# Altium footprint library mastermind.PCBLIB: 1061 footprints (part 34 of 67)
Each footprint in its own frame and in the unit in brackets; x right, y up, seen from the top. Pads: shape width x height; smd on the part's side, far side on the other; paste and mask are expansions set on the pad; w line width, h text height; cw(c..) or ccw(c..) is an arc to the next point about the centre after c.
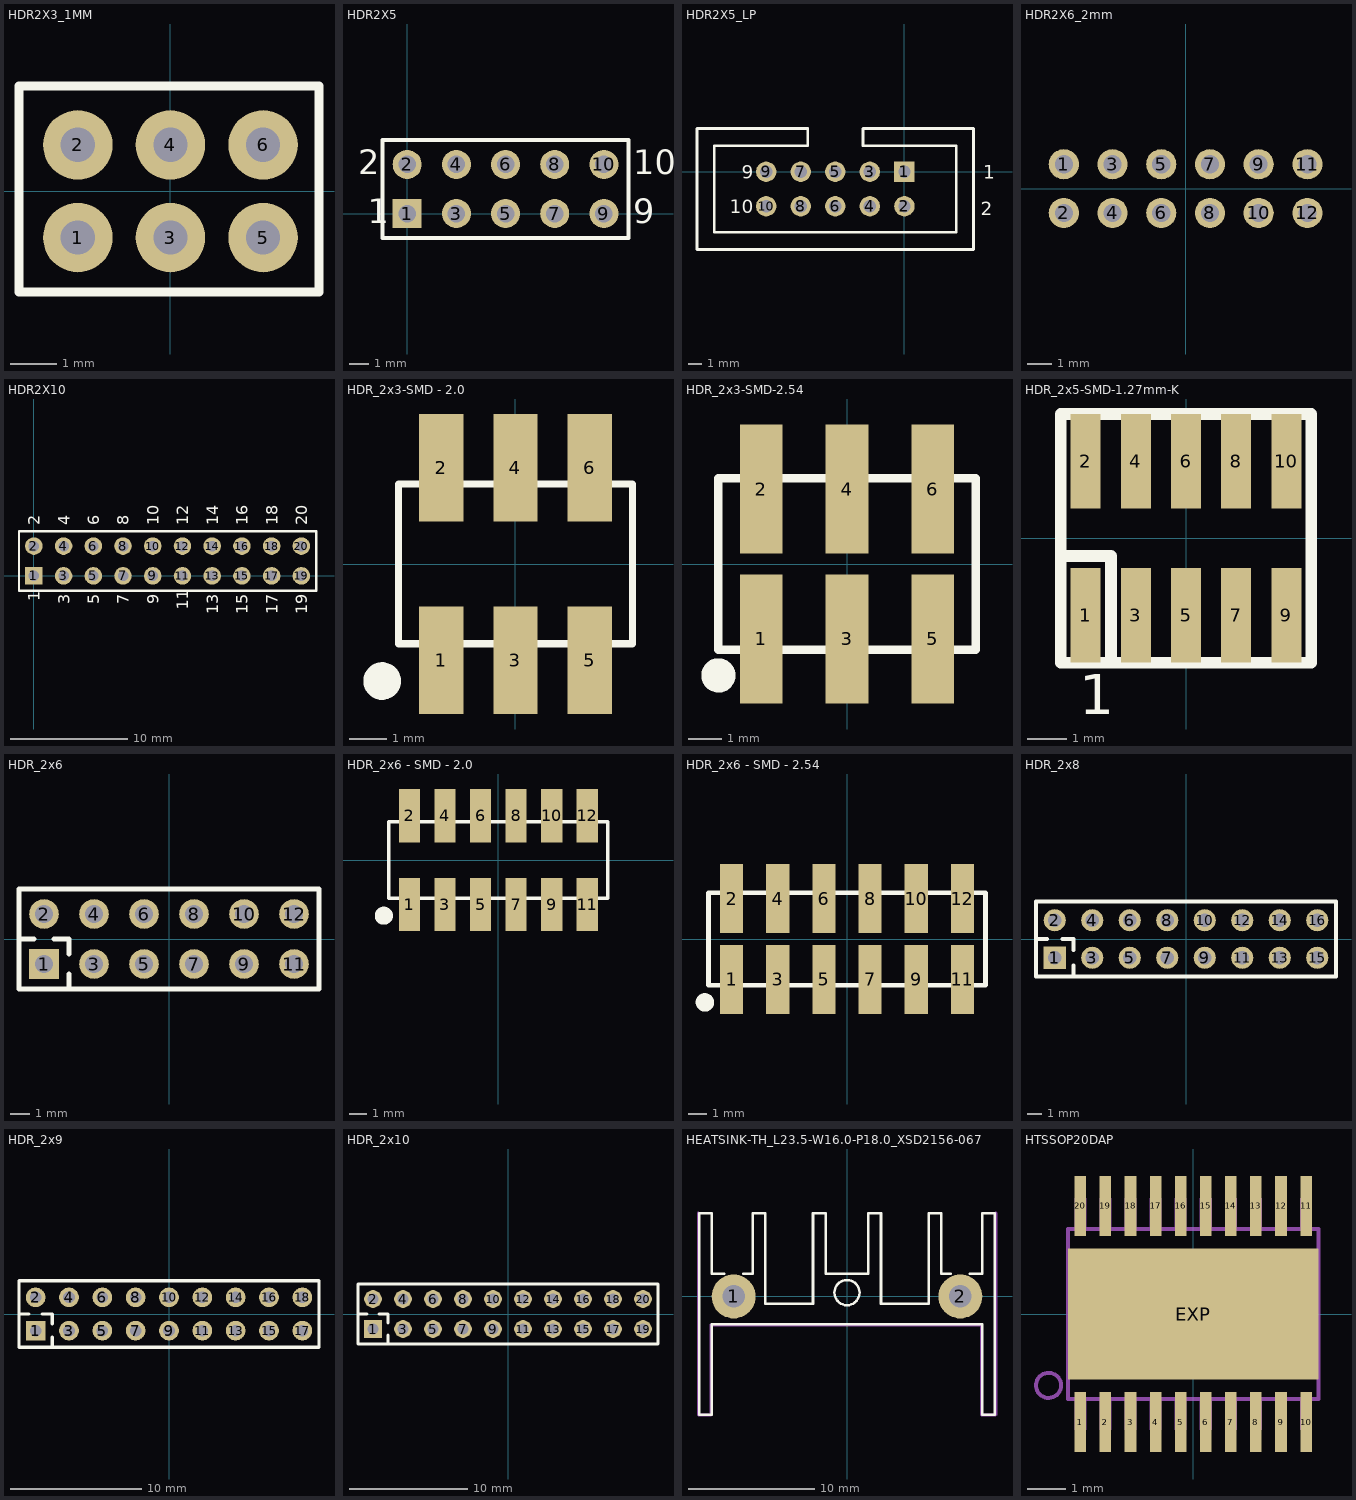
[diagram p33: the footprints below, top view; thin cyan lines are the x and y axes]

## HDR2X3_1MM [mm] "Connector; Header; 3x2 Position"
pads (6):
  round 1.5 / inner round 1.24 / far side round 1.24 hole 0.74: 1(-2,-1) 2(-2,1) 3(0,-1) 4(0,1) 5(2,-1) 6(2,1)
Top Overlay:
  lines w0.2: -3.27,-2.175 3.207,-2.175 3.207,2.27 -3.27,2.27 -3.27,-2.175
Bottom Overlay:

## HDR2X5 [mm] "Connector; Header; 5x2 Position"
height 1.4
pads (10):
  rect 1.5x1.5 hole 0.9: 1(0,0)
  round 1.5 hole 0.9: 2(0,2.54) 3(2.54,0) 4(2.54,2.54) 5(5.08,0) 6(5.08,2.54) 7(7.62,0) 8(7.62,2.54) 9(10.16,0) 10(10.16,2.54)
Top Overlay:
  lines w0.2: -1.27,-1.27 -1.27,3.81 11.43,3.81 11.43,-1.27 -1.27,-1.27
  text "2" at -2.54,2.032 h1.27
  text "1" at -2.032,-0.508 h1.27
  text "9" at 11.684,-0.508 h1.27
  text "10" at 11.684,2.032 h1.27
3D body "CON10_2X5_P100UM_HDR2_TYC.step": height 9.5, standoff -5.08, extent -1.27,-1.27 11.43,3.81

## HDR2X5_LP [mm]
pads (10):
  rect 1.5x1.5 hole 0.9: 1(0.003,0.004)
  round 1.5 hole 0.9: 2(0.003,-2.536) 3(-2.537,0.004) 4(-2.537,-2.536) 5(-5.077,0.004) 6(-5.077,-2.536) 7(-7.617,0.004) 8(-7.617,-2.536) 9(-10.157,0.004) 10(-10.157,-2.536)
Top Overlay:
  lines w0.2: -7.109,1.909 -7.109,3.179 -15.237,3.179 -15.237,-5.711 5.083,-5.711 5.083,3.179 -3.045,3.179 -3.045,1.909 ; -7.1,1.909 -13.967,1.909 -13.967,-4.441 3.813,-4.441 3.813,1.91 -3.05,1.91
  text "2" at 5.603,-3.196 h1
  text "1" at 5.803,-0.496 h1
  text "9" at -11.935,-0.504 h1
  text "10" at -12.824,-3.044 h1
3D body: height 10, standoff 0, extent -15.237,-5.711 5.082,3.178
3D body: height 2, standoff 0, extent -15.24,-5.715 5.08,3.175
3D body: height 10, standoff 0, extent -0.5,-0.5 0.5,0.5
3D body: height 10, standoff 0, extent -3.04,-0.5 -2.04,0.5
3D body: height 10, standoff 0, extent -5.58,-0.5 -4.58,0.5
3D body: height 10, standoff 0, extent -8.12,-0.5 -7.12,0.5
3D body: height 10, standoff 0, extent -10.66,-0.5 -9.66,0.5
3D body: height 10, standoff 0, extent -10.66,-3.04 -9.66,-2.04
3D body: height 10, standoff 0, extent -8.12,-3.04 -7.12,-2.04
3D body: height 10, standoff 0, extent -5.58,-3.04 -4.58,-2.04
3D body: height 10, standoff 0, extent -3.04,-3.04 -2.04,-2.04
3D body: height 10, standoff 0, extent -0.5,-3.04 0.5,-2.04

## HDR2X6_2mm [mm] "Connector; Header; 6x2 Position"
pads (12):
  round 1.24 hole 0.74: 1(-5,1) 2(-5,-1) 3(-3,1) 4(-3,-1) 5(-1,1) 6(-1,-1) 7(1,1) 8(1,-1) 9(3,1) 10(3,-1) 11(5,1) 12(5,-1)
Bottom Overlay:
  lines w0.2: -6.143,-2.175 -6.143,2.143 6.176,2.143 6.176,-2.175 -6.143,-2.175

## HDR2X10 [mm]
pads (20):
  rect 1.5x1.5 hole 0.9: 1(-0.011,0.007)
  round 1.5 hole 0.9: 2(-0.011,2.547) 3(2.529,0.007) 4(2.529,2.547) 5(5.069,0.007) 6(5.069,2.547) 7(7.609,0.007) 8(7.609,2.547) 9(10.149,0.007) 10(10.149,2.547) 11(12.689,0.007) 12(12.689,2.547) 13(15.229,0.007) 14(15.229,2.547) 15(17.769,0.007) 16(17.769,2.547) 17(20.309,0.007) 18(20.309,2.547) 19(22.849,0.007) 20(22.849,2.547)
Top Overlay:
  lines w0.2: -1.281,-1.263 24.119,-1.263 24.119,3.817 -1.281,3.817 -1.281,-1.263
  text "3" at 3.037,-2.406 h1
  text "4" at 3.037,4.325 h1
  text "7" at 8.117,-2.406 h1
  text "8" at 8.117,4.325 h1
  text "9" at 10.657,-2.406 h1
  text "10" at 10.657,4.325 h1
  text "13" at 15.737,-3.295 h1
  text "14" at 15.737,4.325 h1
  text "17" at 20.817,-3.295 h1
  text "18" at 20.817,4.325 h1
  text "5" at 5.577,-2.406 h1
  text "11" at 13.197,-2.914 h1
  text "15" at 18.277,-3.295 h1
  text "6" at 5.577,4.325 h1
  text "12" at 13.197,4.325 h1
  text "16" at 18.277,4.325 h1
  text "2" at 0.497,4.325 h1
  text "1" at 0.497,-2.152 h1
  text "19" at 23.357,-3.295 h1
  text "20" at 23.357,4.325 h1
3D body: height 10, standoff 0, extent -0.5,-0.5 0.5,0.5
3D body: height 10, standoff 0, extent 2.04,-0.5 3.04,0.5
3D body: height 10, standoff 0, extent 4.58,-0.5 5.58,0.5
3D body: height 10, standoff 0, extent 7.12,-0.5 8.12,0.5
3D body: height 10, standoff 0, extent 9.66,-0.5 10.66,0.5
3D body: height 10, standoff 0, extent 12.2,-0.5 13.2,0.5
3D body: height 10, standoff 0, extent 14.74,-0.5 15.74,0.5
3D body: height 10, standoff 0, extent 17.28,-0.5 18.28,0.5
3D body: height 10, standoff 0, extent 19.82,-0.5 20.82,0.5
3D body: height 10, standoff 0, extent 22.36,-0.5 23.36,0.5
3D body: height 10, standoff 0, extent 22.36,2.04 23.36,3.04
3D body: height 10, standoff 0, extent 19.82,2.04 20.82,3.04
3D body: height 10, standoff 0, extent 17.28,2.04 18.28,3.04
3D body: height 10, standoff 0, extent 14.74,2.04 15.74,3.04
3D body: height 10, standoff 0, extent 12.2,2.04 13.2,3.04
3D body: height 10, standoff 0, extent 9.66,2.04 10.66,3.04
3D body: height 10, standoff 0, extent 7.12,2.04 8.12,3.04
3D body: height 10, standoff 0, extent 4.58,2.04 5.58,3.04
3D body: height 10, standoff 0, extent 2.04,2.04 3.04,3.04
3D body: height 10, standoff 0, extent -0.5,2.04 0.5,3.04
3D body: height 2, standoff 0, extent -1.27,-1.27 24.13,3.81

## HDR_2x3-SMD - 2.0 [mm]
pads (6):
  rect 1.2x2.9 smd: 1(-2,-2.6) 2(-2,2.6) 3(0,-2.6) 4(0,2.6) 5(2,-2.6) 6(2,2.6)
Top Overlay:
  circle w0.508: c-3.6,-3.16 r0.254
  lines w0.2: -3.16,-2.158 3.159,-2.158 3.159,2.16 -3.16,2.16 -3.16,-2.158

## HDR_2x3-SMD-2.54 [mil]
pads (6):
  rect 50x150 smd: 1(-100,-87.5) 2(-100,87.5) 3(0,-87.5) 4(0,87.5) 5(100,-87.5) 6(100,87.5)
Top Overlay:
  circle w20: c-150,-130 r10
  lines w10: -150,-100 -150,100 150,100 150,-100 -150,-100
3D body "pin_header_a-sl254-dg-g06mp1.stp": height 382.03, standoff -1.57, extent -149.99,-147.63 150.01,147.64

## HDR_2x5-SMD-1.27mm-K [mm]
pads (10):
  rect 0.76x2.4 smd: 1(-2.54,-1.95) 2(-2.54,1.95) 3(-1.27,-1.95) 4(-1.27,1.95) 5(0,-1.95) 6(0,1.95) 7(1.27,-1.95) 8(1.27,1.95) 9(2.54,-1.95) 10(2.54,1.95)
Top Overlay:
  lines w0.3: -3.175,-0.45 -1.9,-0.45 -1.9,-3.15 ; -3.175,-3.15 -3.175,3.15 3.175,3.15 3.175,-3.15 -3.175,-3.15
  text "1" at -2.7,-4.45 h1.02
3D body "Samtec-FTSH-105-01-F-DV-K.step": height 6.11, standoff -0.01, extent -3.137,-2.921 3.137,2.921

## HDR_2x6 [mm]
pads (12):
  rect 1.5x1.5 hole 0.9: 1(-6.35,-1.27)
  round 1.5 hole 0.9: 2(-6.35,1.27) 3(-3.81,-1.27) 4(-3.81,1.27) 5(-1.27,-1.27) 6(-1.27,1.27) 7(1.27,-1.27) 8(1.27,1.27) 9(3.81,-1.27) 10(3.81,1.27) 11(6.35,-1.27) 12(6.35,1.27)
Top Overlay:
  lines w0.254: -7.62,0 -6.858,0 ; -5.842,0 -5.08,0 -5.08,-0.762 ; -5.08,-2.54 -5.08,-1.778 ; -7.62,-2.54 -7.62,2.54 7.62,2.54 7.62,-2.54 -7.62,-2.54

## HDR_2x6 - SMD - 2.0 [mm]
pads (12):
  rect 1.2x3 smd: 1(-5,-2.5) 2(-5,2.5) 3(-3,-2.5) 4(-3,2.5) 5(-1,-2.5) 6(-1,2.5) 7(1,-2.5) 8(1,2.5) 9(3,-2.5) 10(3,2.5) 11(5,-2.5) 12(5,2.5)
Top Overlay:
  circle w0.508: c-6.44,-3.13 r0.254
  lines w0.2: -6.16,-2.159 6.159,-2.159 6.159,2.159 -6.16,2.159 -6.16,-2.159

## HDR_2x6 - SMD - 2.54 [mm]
pads (12):
  rect 1.27x3.81 smd: 1(-6.35,-2.222) 2(-6.35,2.222) 3(-3.81,-2.222) 4(-3.81,2.222) 5(-1.27,-2.222) 6(-1.27,2.222) 7(1.27,-2.222) 8(1.27,2.222) 9(3.81,-2.222) 10(3.81,2.222) 11(6.35,-2.222) 12(6.35,2.222)
Top Overlay:
  circle w0.508: c-7.82,-3.49 r0.254
  lines w0.254: -7.62,-2.54 -7.62,2.54 7.62,2.54 7.62,-2.54 -7.62,-2.54
3D body "pin_header_a-sl254-dg-g06mp1.stp": height 9.7, standoff -0.04, extent 0,-3.68 7.62,3.82
3D body "pin_header_a-sl254-dg-g06mp1.stp": height 9.7, standoff -0.04, extent -7.64,-3.68 -0.02,3.82

## HDR_2x8 [mm]
pads (16):
  rect 1.5x1.5 hole 0.9: 1(-8.89,-1.27)
  round 1.5 hole 0.9: 2(-8.89,1.27) 3(-6.35,-1.27) 4(-6.35,1.27) 5(-3.81,-1.27) 6(-3.81,1.27) 7(-1.27,-1.27) 8(-1.27,1.27) 9(1.27,-1.27) 10(1.27,1.27) 11(3.81,-1.27) 12(3.81,1.27) 13(6.35,-1.27) 14(6.35,1.27) 15(8.89,-1.27) 16(8.89,1.27)
Top Overlay:
  lines w0.254: -10.16,0 -9.398,0 ; -8.382,0 -7.62,0 -7.62,-0.762 ; -7.62,-2.54 -7.62,-1.778 ; -10.16,-2.54 10.16,-2.54 10.16,2.54 -10.16,2.54 -10.16,-2.54

## HDR_2x9 [mm]
pads (18):
  rect 1.5x1.5 hole 0.9: 1(-10.16,-1.27)
  round 1.5 hole 0.9: 2(-10.16,1.27) 3(-7.62,-1.27) 4(-7.62,1.27) 5(-5.08,-1.27) 6(-5.08,1.27) 7(-2.54,-1.27) 8(-2.54,1.27) 9(0,-1.27) 10(0,1.27) 11(2.54,-1.27) 12(2.54,1.27) 13(5.08,-1.27) 14(5.08,1.27) 15(7.62,-1.27) 16(7.62,1.27) 17(10.16,-1.27) 18(10.16,1.27)
Top Overlay:
  lines w0.254: -11.43,0 -10.668,0 ; -9.652,0 -8.89,0 -8.89,-0.762 ; -8.89,-2.54 -8.89,-1.778 ; -11.43,-2.54 11.43,-2.54 11.43,2.54 -11.43,2.54 -11.43,-2.54

## HDR_2x10 [mm]
pads (20):
  rect 1.5x1.5 hole 0.9: 1(-11.43,-1.27)
  round 1.5 hole 0.9: 2(-11.43,1.27) 3(-8.89,-1.27) 4(-8.89,1.27) 5(-6.35,-1.27) 6(-6.35,1.27) 7(-3.81,-1.27) 8(-3.81,1.27) 9(-1.27,-1.27) 10(-1.27,1.27) 11(1.27,-1.27) 12(1.27,1.27) 13(3.81,-1.27) 14(3.81,1.27) 15(6.35,-1.27) 16(6.35,1.27) 17(8.89,-1.27) 18(8.89,1.27) 19(11.43,-1.27) 20(11.43,1.27)
Top Overlay:
  lines w0.254: -12.7,0 -11.938,0 ; -10.922,0 -10.16,0 -10.16,-0.762 ; -10.16,-2.54 -10.16,-1.778 ; -12.7,-2.54 -12.7,2.54 12.7,2.54 12.7,-2.54 -12.7,-2.54

## HEATSINK-TH_L23.5-W16.0-P18.0_XSD2156-067 [mm]
pads (2):
  round 3.5 hole 1.8 paste-2539.97 mask+0.05: 1(-9,0) 2(9,0)
Top Overlay:
  lines w0.2: -9.756,1.8 -10.75,1.8 -10.75,6.6 -11.75,6.6 -11.75,-9.4 -10.75,-9.4 -10.75,-2.2 10.75,-2.2 10.75,-9.4 11.75,-9.4 11.75,6.6 10.75,6.6 10.75,1.8 9.756,1.8 ; -9.004,-0.8 cw(c-9.002,0) -9,-0.8 ; -8.244,1.8 -7.5,1.8 -7.5,6.6 -6.5,6.6 -6.5,-0.6 -2.7,-0.6 -2.7,6.6 -1.7,6.6 -1.7,1.8 1.7,1.8 1.7,6.6 2.7,6.6 2.7,-0.6 6.5,-0.6 6.5,6.6 7.5,6.6 7.5,1.8 8.244,1.8 ; -0.005,-0.7 cw(c-0.003,0.3) 0,-0.7
Mechanical 15:
  region: -10.895,-9.271 -10.895,-2.286 -10.895,-2.266 -10.88,-2.229 -10.852,-2.201 -10.815,-2.186 -10.795,-2.186 10.668,-2.186 10.688,-2.186 10.725,-2.201 10.753,-2.229 10.768,-2.266 10.768,-2.286 10.768,-9.298 11.711,-9.298 11.711,6.604 11.711,6.645 11.77,6.704 11.852,6.704 11.911,6.645 11.911,6.604 11.911,-9.398 11.911,-9.418 11.896,-9.455 11.868,-9.483 11.831,-9.498 11.811,-9.498 10.668,-9.498 10.648,-9.498 10.611,-9.483 10.583,-9.455 10.568,-9.418 10.568,-9.398 10.568,-2.386 -10.695,-2.386 -10.695,-9.271 -10.695,-9.312 -10.754,-9.371 -10.836,-9.371 -10.895,-9.312
  region: -10.695,-9.271 -10.695,-9.398 -10.695,-9.418 -10.71,-9.455 -10.738,-9.483 -10.775,-9.498 -10.795,-9.498 -11.811,-9.498 -11.831,-9.498 -11.868,-9.483 -11.896,-9.455 -11.911,-9.418 -11.911,-9.398 -11.911,6.604 -11.911,6.645 -11.852,6.704 -11.77,6.704 -11.711,6.645 -11.711,6.604 -11.711,-9.298 -10.895,-9.298 -10.895,-9.271 -10.895,-9.23 -10.836,-9.171 -10.754,-9.171 -10.695,-9.23

## HTSSOP20DAP [mm]
pads (21):
  rect 0.3x1.55 smd: 1(-2.925,-2.8) 2(-2.275,-2.8) 3(-1.625,-2.8) 4(-0.975,-2.8) 5(-0.325,-2.8) 6(0.325,-2.8) 7(0.975,-2.8) 8(1.625,-2.8) 9(2.275,-2.8) 10(2.925,-2.8) 11(2.925,2.8) 12(2.275,2.8) 13(1.625,2.8) 14(0.975,2.8) 15(0.325,2.8) 16(-0.325,2.8) 17(-0.975,2.8) 18(-1.625,2.8) 19(-2.275,2.8) 20(-2.925,2.8)
  rect 6.5x3.4 smd paste-3.25 mask-3.25: EXP(0,0)
Top Paste:
  region: 0,0 0.254,0 0.254,0.254 0,0.254
Top Solder:
  region: 0,0 0.254,0 0.254,0.254 0,0.254
Mechanical 2:
  circle w0.102: c-3.75,-1.85 r0.325
  lines w0.102: -3.25,-2.2 -3.25,2.2 3.25,2.2 3.25,-2.2 -3.25,-2.2
Mechanical 8:
  region: 2.775,-3 2.775,-2.25 3.075,-2.25 3.075,-3
  region: -2.775,3 -2.775,2.25 -3.075,2.25 -3.075,3
  region: -2.125,3 -2.125,2.25 -2.425,2.25 -2.425,3
  region: -1.475,3 -1.475,2.25 -1.775,2.25 -1.775,3
  region: -0.825,3 -0.825,2.25 -1.125,2.25 -1.125,3
  region: -0.175,3 -0.175,2.25 -0.475,2.25 -0.475,3
  region: 0.475,3 0.475,2.25 0.175,2.25 0.175,3
  region: 1.125,3 1.125,2.25 0.825,2.25 0.825,3
  region: 1.775,3 1.775,2.25 1.475,2.25 1.475,3
  region: 2.425,3 2.425,2.25 2.125,2.25 2.125,3
  region: 3.075,3 3.075,2.25 2.775,2.25 2.775,3
  region: 2.125,-3 2.125,-2.25 2.425,-2.25 2.425,-3
  region: 1.475,-3 1.475,-2.25 1.775,-2.25 1.775,-3
  region: 0.825,-3 0.825,-2.25 1.125,-2.25 1.125,-3
  region: 0.175,-3 0.175,-2.25 0.475,-2.25 0.475,-3
  region: -0.475,-3 -0.475,-2.25 -0.175,-2.25 -0.175,-3
  region: -1.125,-3 -1.125,-2.25 -0.825,-2.25 -0.825,-3
  region: -1.775,-3 -1.775,-2.25 -1.475,-2.25 -1.475,-3
  region: -2.425,-3 -2.425,-2.25 -2.125,-2.25 -2.125,-3
  region: -3.075,-3 -3.075,-2.25 -2.775,-2.25 -2.775,-3